# Altium footprint library 按键.PcbLib: 105 footprints (part 2 of 7)
Each footprint in its own frame and in the unit in brackets; x right, y up, seen from the top. Pads: shape width x height; smd on the part's side, far side on the other; paste and mask are expansions set on the pad; w line width, h text height; cw(c..) or ccw(c..) is an arc to the next point about the centre after c.
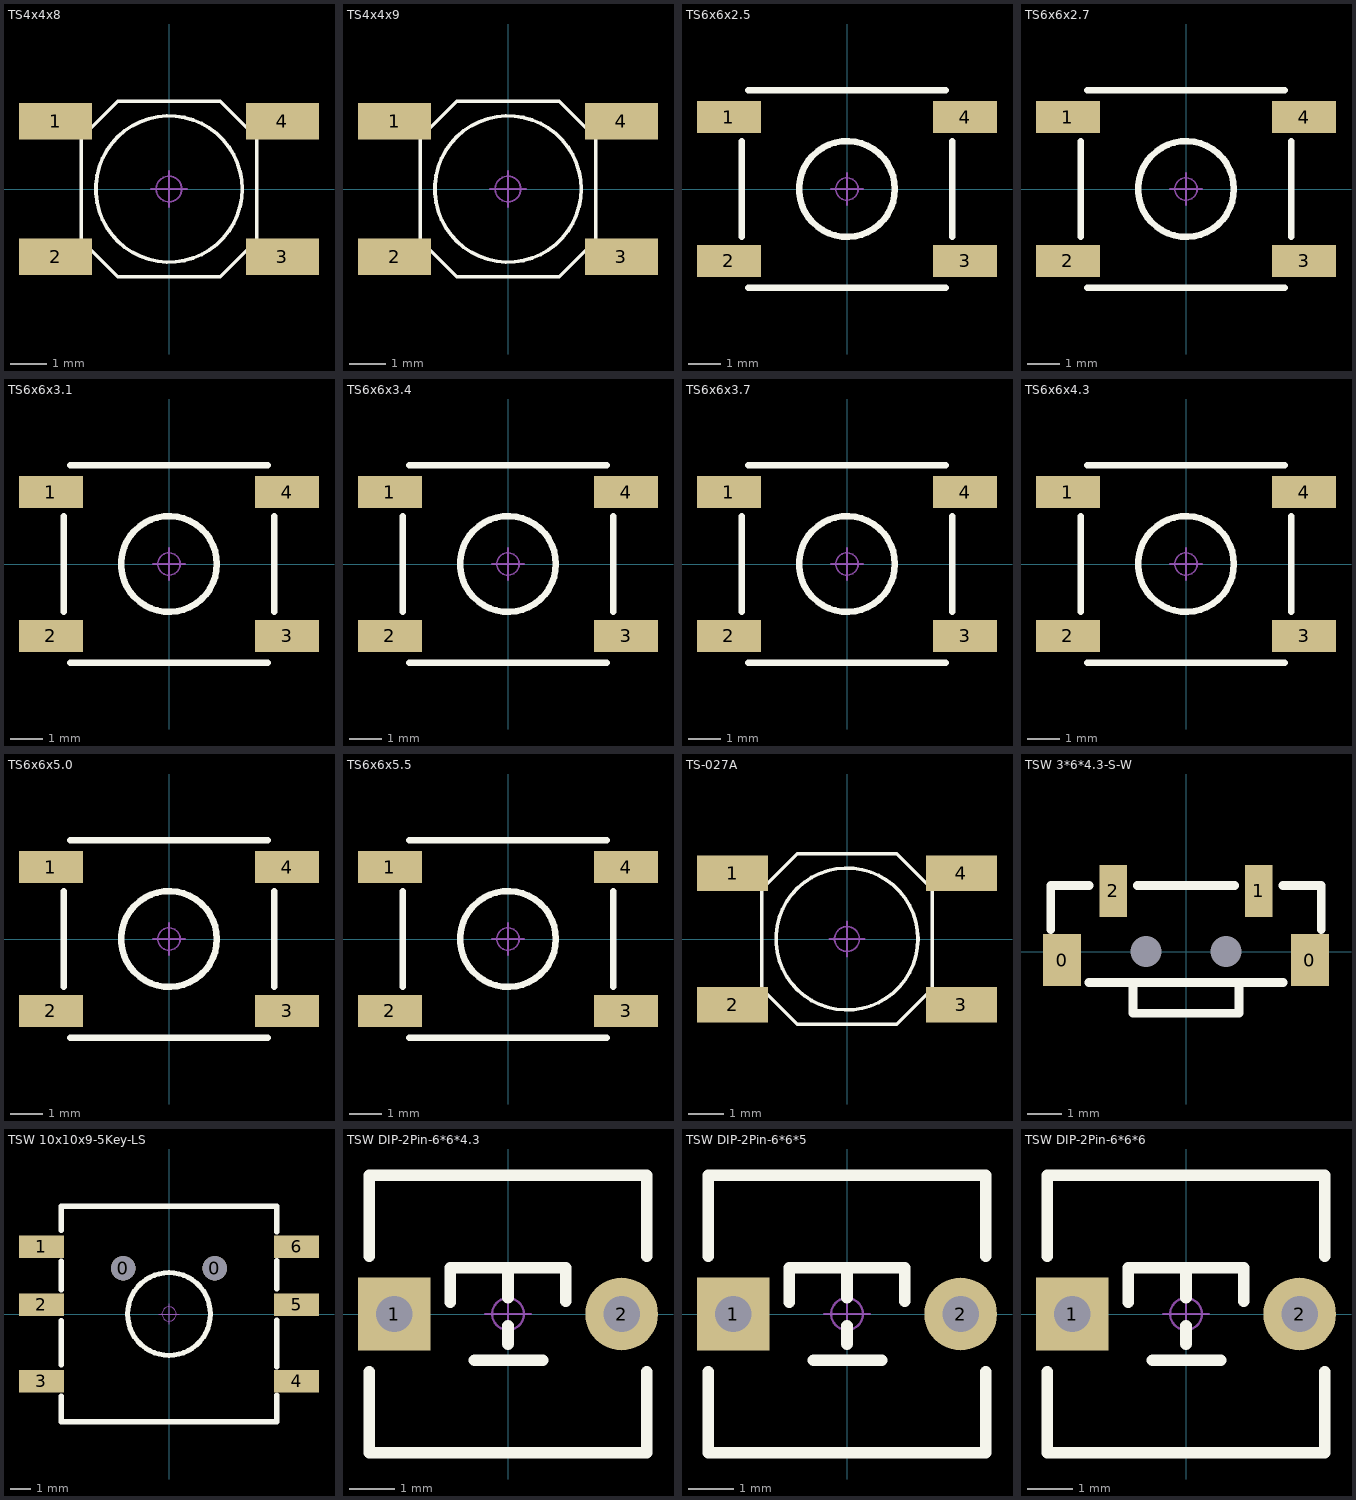
[diagram p1: the footprints below, top view; thin cyan lines are the x and y axes]

## TS4x4x8 [mm] "防水轻触开关4x4x8"
pads (4):
  rect 2x1 smd: 1(-3.1,1.85) 2(-3.1,-1.85) 3(3.1,-1.85) 4(3.1,1.85)
Top Overlay:
  circle w0.1: c0,0 r2
  lines w0.1: -2.4,-1.4 -2.4,1.4 -1.4,2.4 1.4,2.4 2.4,1.4 2.4,-1.4 1.4,-2.4 -1.4,-2.4 -2.4,-1.4 ; 0,-2.4 0,-2.4 ; 0,2.4 0,2.4
Mechanical 15:
  circle w0.05: c0,0 r0.35
  lines w0.05: -0.5,0 0.5,0 ; 0,-0.5 0,0.5
3D body "4x4x8.0.STEP": height 8, standoff -0.05, extent -3.2,-2.6 3.2,2.6

## TS4x4x9 [mm] "防水轻触开关4x4x9"
pads (4):
  rect 2x1 smd: 1(-3.1,1.85) 2(-3.1,-1.85) 3(3.1,-1.85) 4(3.1,1.85)
Top Overlay:
  circle w0.1: c0,0 r2
  lines w0.1: -2.4,-1.4 -1.4,-2.4 1.4,-2.4 2.4,-1.4 2.4,1.4 1.4,2.4 -1.4,2.4 -2.4,1.4 -2.4,-1.4 ; 0,-2.4 0,-2.4 ; 0,2.4 0,2.4
Mechanical 15:
  circle w0.05: c0,0 r0.35
  lines w0.05: -0.5,0 0.5,0 ; 0,-0.5 0,0.5
3D body "4x4x9.0.STEP": height 9, standoff -0.05, extent -3.2,-2.6 3.2,2.6

## TS6x6x2.5 [mm] "贴片轻触开关6x6x2.5"
pads (4):
  rect 2x1 smd: 1(-3.7,2.25) 2(-3.7,-2.25) 3(3.7,-2.25) 4(3.7,2.25)
Top Overlay:
  circle w0.203: c0,0 r1.5
  lines w0.203: -3.3,-1.5 -3.3,1.5 ; -3.1,-3.1 3.1,-3.1 ; -3.1,3.1 3.1,3.1 ; 3.3,-1.5 3.3,1.5
Mechanical 15:
  circle w0.05: c0,0 r0.35
  lines w0.05: -0.5,0 0.5,0 ; 0,-0.5 0,0.5
3D body "6x6x2.5.STEP": height 2.5, standoff -0.05, extent -4.3,-3.1 4.3,3.1

## TS6x6x2.7 [mm] "贴片轻触开关6x6x2.7"
pads (4):
  rect 2x1 smd: 1(-3.7,2.25) 2(-3.7,-2.25) 3(3.7,-2.25) 4(3.7,2.25)
Top Overlay:
  circle w0.203: c0,0 r1.5
  lines w0.203: -3.3,-1.5 -3.3,1.5 ; -3.1,-3.1 3.1,-3.1 ; -3.1,3.1 3.1,3.1 ; 3.3,-1.5 3.3,1.5
Mechanical 15:
  circle w0.05: c0,0 r0.35
  lines w0.05: -0.5,0 0.5,0 ; 0,-0.5 0,0.5
3D body "6x6x2.7.STEP": height 2.7, standoff -0.05, extent -4.3,-3.1 4.3,3.1

## TS6x6x3.1 [mm] "贴片轻触开关6x6x3.1"
pads (4):
  rect 2x1 smd: 1(-3.7,2.25) 2(-3.7,-2.25) 3(3.7,-2.25) 4(3.7,2.25)
Top Overlay:
  circle w0.203: c0,0 r1.5
  lines w0.203: -3.3,-1.5 -3.3,1.5 ; -3.1,-3.1 3.1,-3.1 ; -3.1,3.1 3.1,3.1 ; 3.3,-1.5 3.3,1.5
Mechanical 15:
  circle w0.05: c0,0 r0.35
  lines w0.05: -0.5,0 0.5,0 ; 0,-0.5 0,0.5
3D body "6x6x3.1.STEP": height 3.1, standoff -0.05, extent -4.3,-3.1 4.3,3.1

## TS6x6x3.4 [mm] "贴片轻触开关6x6x3.4"
pads (4):
  rect 2x1 smd: 1(-3.7,2.25) 2(-3.7,-2.25) 3(3.7,-2.25) 4(3.7,2.25)
Top Overlay:
  circle w0.203: c0,0 r1.5
  lines w0.203: -3.3,-1.5 -3.3,1.5 ; -3.1,-3.1 3.1,-3.1 ; -3.1,3.1 3.1,3.1 ; 3.3,-1.5 3.3,1.5
Mechanical 15:
  circle w0.05: c0,0 r0.35
  lines w0.05: -0.5,0 0.5,0 ; 0,-0.5 0,0.5
3D body "6x6x3.4.STEP": height 3.4, standoff -0.05, extent -4.3,-3.1 4.3,3.1

## TS6x6x3.7 [mm] "贴片轻触开关6x6x3.7"
pads (4):
  rect 2x1 smd: 1(-3.7,2.25) 2(-3.7,-2.25) 3(3.7,-2.25) 4(3.7,2.25)
Top Overlay:
  circle w0.203: c0,0 r1.5
  lines w0.203: -3.3,-1.5 -3.3,1.5 ; -3.1,-3.1 3.1,-3.1 ; -3.1,3.1 3.1,3.1 ; 3.3,-1.5 3.3,1.5
Mechanical 15:
  circle w0.05: c0,0 r0.35
  lines w0.05: -0.5,0 0.5,0 ; 0,-0.5 0,0.5
3D body "6x6x3.7.STEP": height 3.7, standoff -0.05, extent -4.3,-3.1 4.3,3.1

## TS6x6x4.3 [mm] "贴片轻触开关6x6x4.3"
pads (4):
  rect 2x1 smd: 1(-3.7,2.25) 2(-3.7,-2.25) 3(3.7,-2.25) 4(3.7,2.25)
Top Overlay:
  circle w0.203: c0,0 r1.5
  lines w0.203: -3.3,-1.5 -3.3,1.5 ; -3.1,-3.1 3.1,-3.1 ; -3.1,3.1 3.1,3.1 ; 3.3,-1.5 3.3,1.5
Mechanical 15:
  circle w0.05: c0,0 r0.35
  lines w0.05: -0.5,0 0.5,0 ; 0,-0.5 0,0.5
3D body "6x6x4.3.STEP": height 4.3, standoff -0.05, extent -4.3,-3.1 4.3,3.1

## TS6x6x5.0 [mm] "贴片轻触开关6x6x5.0"
pads (4):
  rect 2x1 smd: 1(-3.7,2.25) 2(-3.7,-2.25) 3(3.7,-2.25) 4(3.7,2.25)
Top Overlay:
  circle w0.203: c0,0 r1.5
  lines w0.203: -3.3,-1.5 -3.3,1.5 ; -3.1,-3.1 3.1,-3.1 ; -3.1,3.1 3.1,3.1 ; 3.3,-1.5 3.3,1.5
Mechanical 15:
  circle w0.05: c0,0 r0.35
  lines w0.05: -0.5,0 0.5,0 ; 0,-0.5 0,0.5
3D body "6x6x5.0.STEP": height 5, standoff -0.05, extent -4.3,-3.1 4.3,3.1

## TS6x6x5.5 [mm] "贴片轻触开关6x6x5.5"
pads (4):
  rect 2x1 smd: 1(-3.7,2.25) 2(-3.7,-2.25) 3(3.7,-2.25) 4(3.7,2.25)
Top Overlay:
  circle w0.203: c0,0 r1.5
  lines w0.203: -3.3,-1.5 -3.3,1.5 ; -3.1,-3.1 3.1,-3.1 ; -3.1,3.1 3.1,3.1 ; 3.3,-1.5 3.3,1.5
Mechanical 15:
  circle w0.05: c0,0 r0.35
  lines w0.05: -0.5,0 0.5,0 ; 0,-0.5 0,0.5
3D body "6x6x5.5.STEP": height 5.5, standoff -0.05, extent -4.3,-3.1 4.3,3.1

## TS-027A [mm] "4x4x0.8"
pads (4):
  rect 2x1 smd: 1(-3.225,1.85) 2(-3.225,-1.85) 3(3.225,-1.85) 4(3.225,1.85)
Top Overlay:
  circle w0.1: c0,0 r2
  lines w0.1: -2.4,-1.4 -1.4,-2.4 1.4,-2.4 2.4,-1.4 2.4,1.4 1.4,2.4 -1.4,2.4 -2.4,1.4 -2.4,-1.4 ; 0,-2.4 0,-2.4 ; 0,2.4 0,2.4
Mechanical 15:
  circle w0.05: c0,0 r0.35
  lines w0.05: -0.5,0 0.5,0 ; 0,-0.5 0,0.5
3D body "4x4x0.8.STEP": height 0.8, standoff -0.05, extent -3.225,-2.4 3.225,2.4

## TSW 3*6*4.3-S-W [mm] "侧立贴片3*6*4.3"
pads (6):
  rect 1.1x1.5 smd: 0(-3.575,-0.25) 0(3.575,-0.25)
  round 0 hole 0.9: 0(-1.15,0) 0(1.15,0)
  rect 0.8x1.5 smd: 1(2.1,1.75) 2(-2.1,1.75)
Top Overlay:
  lines w0.254: -3.9,0.635 -3.9,1.9 -3.895,1.905 -2.794,1.905 ; -2.794,-0.889 2.794,-0.889 ; -1.524,-0.889 -1.524,-1.778 1.524,-1.778 1.524,-0.889 ; -1.397,1.905 1.397,1.905 ; 2.794,1.905 3.895,1.905 3.9,1.91 3.9,0.635
3D body "TSW 3x6x4.3-S-W.STEP": height 3.51, standoff -0.74, extent -3.9,-1.79 3.9,1.91

## TSW 10x10x9-5Key-LS [mm] "6脚，长：10.5，宽：10，高：9mm"
pads (8):
  round 1.2 hole 1.2: 0(-2.25,2.25) 0(2.25,2.25)
  rect 2.2x1.1 smd: 1(-6.262,3.3) 2(-6.262,0.45) 3(-6.262,-3.3) 4(6.262,-3.3) 5(6.262,0.45) 6(6.262,3.3)
Top Overlay:
  circle w0.25: c0,0 r2.032
  lines w0.254: -5.287,-4.017 -5.287,-5.287 5.287,-5.287 5.287,-3.984 ; -5.287,-2.493 -5.287,-0.334 ; -5.287,1.19 -5.287,2.587 ; -5.287,4.111 -5.287,5.287 5.287,5.287 5.287,4.017 ; 5.287,-2.587 5.287,-0.301 ; 5.287,1.223 5.287,2.62
Mechanical 15:
  circle w0.05: c0,0 r0.35
  lines w0.05: -0.5,0 0.5,0 ; 0,-0.5 0,0.5
3D body "TSW 10x10x9-5Key-LS.STEP": height 9.05, standoff -0.65, extent -6.5,-5.16 6.5,5.16

## TSW DIP-2Pin-6*6*4.3 [mm] "2Pin，6*6*4.3mm"
pads (2):
  rect 1.6x1.6 hole 0.8: 1(-2.5,0)
  round 1.6 hole 0.8: 2(2.5,0)
Top Overlay:
  lines w0.254: -3.048,-1.27 -3.048,-3.048 3.048,-3.048 3.048,-1.27 ; -3.048,1.27 -3.048,3.048 3.048,3.048 3.048,1.27 ; -1.27,0.254 -1.27,1.016 1.27,1.016 1.27,0.279 ; -0.737,-1.016 0.762,-1.016 ; 0,-0.66 0,-0.254 ; 0,0.356 0,1.016
Mechanical 15:
  circle w0.05: c0,0 r0.35
  lines w0.05: -0.5,0 0.5,0 ; 0,-0.5 0,0.5
3D body "TSW DIP-2Pin-6x6x4.3.STEP": height 4.35, standoff -3.45, extent -3,-3 3,3

## TSW DIP-2Pin-6*6*5 [mm] "2Pin，6*6*5mm"
pads (2):
  rect 1.6x1.6 hole 0.8: 1(-2.5,0)
  round 1.6 hole 0.8: 2(2.5,0)
Top Overlay:
  lines w0.254: -3.048,-1.27 -3.048,-3.048 3.048,-3.048 3.048,-1.27 ; -3.048,1.27 -3.048,3.048 3.048,3.048 3.048,1.27 ; -1.27,0.254 -1.27,1.016 1.27,1.016 1.27,0.279 ; -0.737,-1.016 0.762,-1.016 ; 0,-0.66 0,-0.254 ; 0,0.356 0,1.016
Mechanical 15:
  circle w0.05: c0,0 r0.35
  lines w0.05: -0.5,0 0.5,0 ; 0,-0.5 0,0.5
3D body "TSW DIP-2Pin-6x6x5.STEP": height 5.05, standoff -3.45, extent -3,-3 3,3

## TSW DIP-2Pin-6*6*6 [mm] "2Pin，6*6*6mm"
pads (2):
  rect 1.6x1.6 hole 0.8: 1(-2.5,0)
  round 1.6 hole 0.8: 2(2.5,0)
Top Overlay:
  lines w0.254: -3.048,-1.27 -3.048,-3.048 3.048,-3.048 3.048,-1.27 ; -3.048,1.27 -3.048,3.048 3.048,3.048 3.048,1.27 ; -1.27,0.254 -1.27,1.016 1.27,1.016 1.27,0.279 ; -0.737,-1.016 0.762,-1.016 ; 0,-0.66 0,-0.254 ; 0,0.356 0,1.016
Mechanical 15:
  circle w0.05: c0,0 r0.35
  lines w0.05: -0.5,0 0.5,0 ; 0,-0.5 0,0.5
3D body "TSW DIP-2Pin-6x6x6.STEP": height 6.05, standoff -3.45, extent -3,-3 3,3